# Altium footprint library PcbLib.PcbLib: 65 footprints (part 5 of 5)
Each footprint in its own frame and in the unit in brackets; x right, y up, seen from the top. Pads: shape width x height; smd on the part's side, far side on the other; paste and mask are expansions set on the pad; w line width, h text height; cw(c..) or ccw(c..) is an arc to the next point about the centre after c.
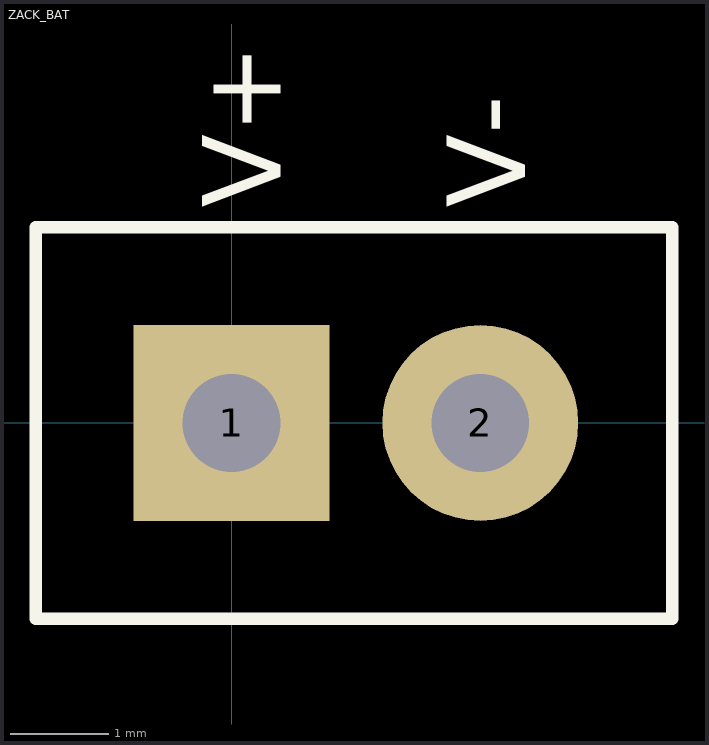
[diagram p4: the footprint, top view; thin cyan lines are the x and y axes]

## ZACK_BAT [mm] "HEADER, SINGLE, DISTANCE = 100mil"
pads (2):
  rect 2x2 hole 1: 1(0,0)
  round 2 hole 1: 2(2.54,0)
Top Overlay:
  lines w0.127: -2,-2 4.5,-2 4.5,2 -2,2 -2,-2
  text "V-" at 3,2.2 h0.8
  text "V+" at 0.5,2.2 h0.8
3D body "User Library-Header1x2.STEP": height 8.17, standoff -2.81, extent -1.34,-1.3 3.74,1.24